# Altium integrated library Altium_WCAP-ATLI_rev19a.IntLib: 162 symbols (part 1 of 2) (continued)
## 860080374010
designator C?, comment 270uF, 16V
WCAP-ATLI THT Aluminum Electrolytic Capacitors, D8mm x L11.5mm, 270uF, +/-20%, 16VDC; Part Number: 860080374010; Dissipation Factor: 12%; Endurance: 3000h; Leakage Current: 43.2uA; Ripple Current max.: 600mA; Technical Reference: ATEE115271M016DSPA7C000; ComponentLink1Description: Manufacturer; ComponentLink1URL: http://www.we-online.de; ComponentLink2Description: Datasheet; ComponentLink2URL: https://katalog.we-online.com/pbs/datasheet/860080374010.pdf; Length: 11.5mm; Mounting Technology: THT; Operating Temperature: -55 to +105degC; Packaging: Ammo Pack; Published Date: August 2019; Capacitance: 270uF; Diameter: 8mm; Publisher: Wurth Elektronik; Capacitance Tolerance: +/-20%; Rated Voltage: 16VDC
footprint WCAP-ATLI_8x11.5
pins: 1 N, 2 P

## 860080374011
designator C?, comment 330uF, 16V
WCAP-ATLI THT Aluminum Electrolytic Capacitors, D8mm x L11.5mm, 330uF, +/-20%, 16VDC; Part Number: 860080374011; Dissipation Factor: 12%; Endurance: 3000h; Leakage Current: 52.8uA; Ripple Current max.: 740mA; Technical Reference: ATEE115331M016DSPA7C000; ComponentLink1Description: Manufacturer; ComponentLink1URL: http://www.we-online.de; ComponentLink2Description: Datasheet; ComponentLink2URL: https://katalog.we-online.com/pbs/datasheet/860080374011.pdf; Length: 11.5mm; Mounting Technology: THT; Operating Temperature: -55 to +105degC; Packaging: Ammo Pack; Published Date: August 2019; Capacitance: 330uF; Diameter: 8mm; Publisher: Wurth Elektronik; Capacitance Tolerance: +/-20%; Rated Voltage: 16VDC
footprint WCAP-ATLI_8x11.5
pins: 1 N, 2 P

## 860080374012
designator C?, comment 390uF, 16V
WCAP-ATLI THT Aluminum Electrolytic Capacitors, D8mm x L16mm, 390uF, +/-20%, 16VDC; Part Number: 860080374012; Dissipation Factor: 12%; Endurance: 3000h; Leakage Current: 62.4uA; Ripple Current max.: 790mA; Technical Reference: ATEE160391M016DSPA7C000; ComponentLink1Description: Manufacturer; ComponentLink1URL: http://www.we-online.de; ComponentLink2Description: Datasheet; ComponentLink2URL: https://katalog.we-online.com/pbs/datasheet/860080374012.pdf; Length: 16mm; Mounting Technology: THT; Operating Temperature: -55 to +105degC; Packaging: Ammo Pack; Published Date: August 2019; Capacitance: 390uF; Diameter: 8mm; Publisher: Wurth Elektronik; Capacitance Tolerance: +/-20%; Rated Voltage: 16VDC
footprint WCAP-ATLI_8x16
pins: 1 N, 2 P

## 860080374013
designator C?, comment 470uF, 16V
WCAP-ATLI THT Aluminum Electrolytic Capacitors, D8mm x L16mm, 470uF, +/-20%, 16VDC; Part Number: 860080374013; Dissipation Factor: 12%; Endurance: 3000h; Leakage Current: 75.2uA; Ripple Current max.: 990mA; Technical Reference: ATEE160471M016DSPA7C000; ComponentLink1Description: Manufacturer; ComponentLink1URL: http://www.we-online.de; ComponentLink2Description: Datasheet; ComponentLink2URL: https://katalog.we-online.com/pbs/datasheet/860080374013.pdf; Length: 16mm; Mounting Technology: THT; Operating Temperature: -55 to +105degC; Packaging: Ammo Pack; Published Date: August 2019; Capacitance: 470uF; Diameter: 8mm; Publisher: Wurth Elektronik; Capacitance Tolerance: +/-20%; Rated Voltage: 16VDC
footprint WCAP-ATLI_8x16
pins: 1 N, 2 P

## 860080374015
designator C?, comment 560uF, 16V
WCAP-ATLI THT Aluminum Electrolytic Capacitors, D8mm x L20mm, 560uF, +/-20%, 16VDC; Part Number: 860080374015; Dissipation Factor: 12%; Endurance: 3000h; Leakage Current: 89.6uA; Ripple Current max.: 1070mA; Technical Reference: ATEE200561M016DSPA7C000; ComponentLink1Description: Manufacturer; ComponentLink1URL: http://www.we-online.de; ComponentLink2Description: Datasheet; ComponentLink2URL: https://katalog.we-online.com/pbs/datasheet/860080374015.pdf; Length: 20mm; Mounting Technology: THT; Operating Temperature: -55 to +105degC; Packaging: Ammo Pack; Published Date: August 2019; Capacitance: 560uF; Diameter: 8mm; Publisher: Wurth Elektronik; Capacitance Tolerance: +/-20%; Rated Voltage: 16VDC
footprint WCAP-ATLI_8x20
pins: 1 N, 2 P

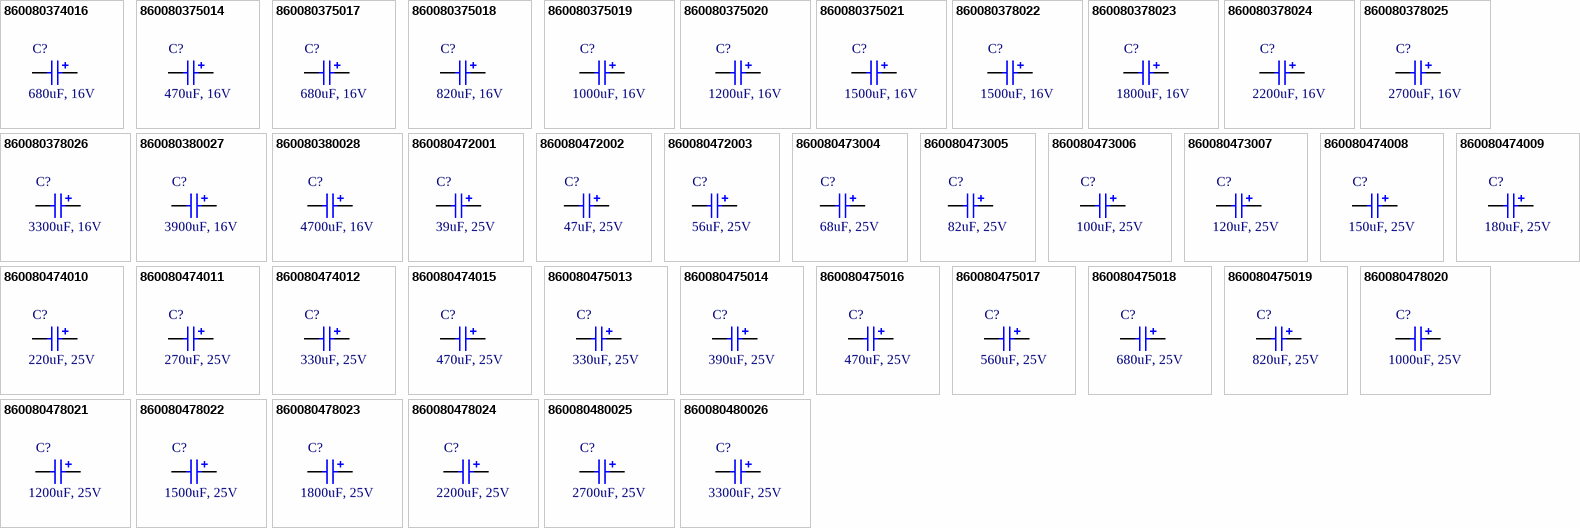
[diagram p1: symbols 860080374016 to 860080480026]

## 860080374016
designator C?, comment 680uF, 16V
WCAP-ATLI THT Aluminum Electrolytic Capacitors, D8mm x L20mm, 680uF, +/-20%, 16VDC; Part Number: 860080374016; Dissipation Factor: 12%; Endurance: 3000h; Leakage Current: 108.8uA; Ripple Current max.: 1120mA; Technical Reference: ATEE200681M016DSPA7C000; ComponentLink1Description: Manufacturer; ComponentLink1URL: http://www.we-online.de; ComponentLink2Description: Datasheet; ComponentLink2URL: https://katalog.we-online.com/pbs/datasheet/860080374016.pdf; Length: 20mm; Mounting Technology: THT; Operating Temperature: -55 to +105degC; Packaging: Ammo Pack; Published Date: August 2019; Capacitance: 680uF; Diameter: 8mm; Publisher: Wurth Elektronik; Capacitance Tolerance: +/-20%; Rated Voltage: 16VDC
footprint WCAP-ATLI_8x20
pins: 1 N, 2 P

## 860080375014
designator C?, comment 470uF, 16V
WCAP-ATLI THT Aluminum Electrolytic Capacitors, D10mm x L12.5mm, 470uF, +/-20%, 16VDC; Part Number: 860080375014; Dissipation Factor: 12%; Endurance: 5000h; Leakage Current: 75.2uA; Ripple Current max.: 1000mA; Technical Reference: ATEF125471M016DSPA9E000; ComponentLink1Description: Manufacturer; ComponentLink1URL: http://www.we-online.de; ComponentLink2Description: Datasheet; ComponentLink2URL: https://katalog.we-online.com/pbs/datasheet/860080375014.pdf; Length: 12.5mm; Mounting Technology: THT; Operating Temperature: -55 to +105degC; Packaging: Ammo Pack; Published Date: August 2019; Capacitance: 470uF; Diameter: 10mm; Publisher: Wurth Elektronik; Capacitance Tolerance: +/-20%; Rated Voltage: 16VDC
footprint WCAP-ATLI_10x12.5
pins: 1 N, 2 P

## 860080375017
designator C?, comment 680uF, 16V
WCAP-ATLI THT Aluminum Electrolytic Capacitors, D10mm x L16mm, 680uF, +/-20%, 16VDC; Part Number: 860080375017; Dissipation Factor: 12%; Endurance: 5000h; Leakage Current: 108.8uA; Ripple Current max.: 1280mA; Technical Reference: ATEF160681M016DSPAAE000; ComponentLink1Description: Manufacturer; ComponentLink1URL: http://www.we-online.de; ComponentLink2Description: Datasheet; ComponentLink2URL: https://katalog.we-online.com/pbs/datasheet/860080375017.pdf; Length: 16mm; Mounting Technology: THT; Operating Temperature: -55 to +105degC; Packaging: Ammo Pack; Published Date: August 2019; Capacitance: 680uF; Diameter: 10mm; Publisher: Wurth Elektronik; Capacitance Tolerance: +/-20%; Rated Voltage: 16VDC
footprint WCAP-ATLI_10x16
pins: 1 N, 2 P

## 860080375018
designator C?, comment 820uF, 16V
WCAP-ATLI THT Aluminum Electrolytic Capacitors, D10mm x L20mm, 820uF, +/-20%, 16VDC; Part Number: 860080375018; Dissipation Factor: 12%; Endurance: 5000h; Leakage Current: 131.2uA; Ripple Current max.: 1400mA; Technical Reference: ATEF200821M016DSPAAE000; ComponentLink1Description: Manufacturer; ComponentLink1URL: http://www.we-online.de; ComponentLink2Description: Datasheet; ComponentLink2URL: https://katalog.we-online.com/pbs/datasheet/860080375018.pdf; Length: 20mm; Mounting Technology: THT; Operating Temperature: -55 to +105degC; Packaging: Ammo Pack; Published Date: August 2019; Capacitance: 820uF; Diameter: 10mm; Publisher: Wurth Elektronik; Capacitance Tolerance: +/-20%; Rated Voltage: 16VDC
footprint WCAP-ATLI_10x20
pins: 1 N, 2 P

## 860080375019
designator C?, comment 1000uF, 16V
WCAP-ATLI THT Aluminum Electrolytic Capacitors, D10mm x L20mm, 1000uF, +/-20%, 16VDC; Part Number: 860080375019; Dissipation Factor: 12%; Endurance: 5000h; Leakage Current: 160uA; Ripple Current max.: 1840mA; Technical Reference: ATEF200102M016DSPAAE000; ComponentLink1Description: Manufacturer; ComponentLink1URL: http://www.we-online.de; ComponentLink2Description: Datasheet; ComponentLink2URL: https://katalog.we-online.com/pbs/datasheet/860080375019.pdf; Length: 20mm; Mounting Technology: THT; Operating Temperature: -55 to +105degC; Packaging: Ammo Pack; Published Date: August 2019; Capacitance: 1000uF; Diameter: 10mm; Publisher: Wurth Elektronik; Capacitance Tolerance: +/-20%; Rated Voltage: 16VDC
footprint WCAP-ATLI_10x20
pins: 1 N, 2 P

## 860080375020
designator C?, comment 1200uF, 16V
WCAP-ATLI THT Aluminum Electrolytic Capacitors, D10mm x L25mm, 1200uF, +/-20%, 16VDC; Part Number: 860080375020; Dissipation Factor: 12%; Endurance: 5000h; Leakage Current: 192uA; Ripple Current max.: 1920mA; Technical Reference: ATEF250122M016DSPAAE000; ComponentLink1Description: Manufacturer; ComponentLink1URL: http://www.we-online.de; ComponentLink2Description: Datasheet; ComponentLink2URL: https://katalog.we-online.com/pbs/datasheet/860080375020.pdf; Length: 25mm; Mounting Technology: THT; Operating Temperature: -55 to +105degC; Packaging: Ammo Pack; Published Date: August 2019; Capacitance: 1200uF; Diameter: 10mm; Publisher: Wurth Elektronik; Capacitance Tolerance: +/-20%; Rated Voltage: 16VDC
footprint WCAP-ATLI_10x25
pins: 1 N, 2 P

## 860080375021
designator C?, comment 1500uF, 16V
WCAP-ATLI THT Aluminum Electrolytic Capacitors, D10mm x L25mm, 1500uF, +/-20%, 16VDC; Part Number: 860080375021; Dissipation Factor: 12%; Endurance: 5000h; Leakage Current: 240uA; Ripple Current max.: 2050mA; Technical Reference: ATEF250152M016DSPAAE000; ComponentLink1Description: Manufacturer; ComponentLink1URL: http://www.we-online.de; ComponentLink2Description: Datasheet; ComponentLink2URL: https://katalog.we-online.com/pbs/datasheet/860080375021.pdf; Length: 25mm; Mounting Technology: THT; Operating Temperature: -55 to +105degC; Packaging: Ammo Pack; Published Date: August 2019; Capacitance: 1500uF; Diameter: 10mm; Publisher: Wurth Elektronik; Capacitance Tolerance: +/-20%; Rated Voltage: 16VDC
footprint WCAP-ATLI_10x25
pins: 1 N, 2 P

## 860080378022
designator C?, comment 1500uF, 16V
WCAP-ATLI THT Aluminum Electrolytic Capacitors, D13mm x L20mm, 1500uF, +/-20%, 16VDC; Part Number: 860080378022; Dissipation Factor: 12%; Endurance: 5000h; Leakage Current: 240uA; Ripple Current max.: 2200mA; Technical Reference: ATEI200152M016DSPACE000; ComponentLink1Description: Manufacturer; ComponentLink1URL: http://www.we-online.de; ComponentLink2Description: Datasheet; ComponentLink2URL: https://katalog.we-online.com/pbs/datasheet/860080378022.pdf; Length: 20mm; Mounting Technology: THT; Operating Temperature: -55 to +105degC; Packaging: Ammo Pack; Published Date: August 2019; Capacitance: 1500uF; Diameter: 13mm; Publisher: Wurth Elektronik; Capacitance Tolerance: +/-20%; Rated Voltage: 16VDC
footprint WCAP-ATLI_13x20
pins: 1 N, 2 P

## 860080378023
designator C?, comment 1800uF, 16V
WCAP-ATLI THT Aluminum Electrolytic Capacitors, D13mm x L20mm, 1800uF, +/-20%, 16VDC; Part Number: 860080378023; Dissipation Factor: 12%; Endurance: 5000h; Leakage Current: 288uA; Ripple Current max.: 2380mA; Technical Reference: ATEI200182M016DSPACE000; ComponentLink1Description: Manufacturer; ComponentLink1URL: http://www.we-online.de; ComponentLink2Description: Datasheet; ComponentLink2URL: https://katalog.we-online.com/pbs/datasheet/860080378023.pdf; Length: 20mm; Mounting Technology: THT; Operating Temperature: -55 to +105degC; Packaging: Ammo Pack; Published Date: August 2019; Capacitance: 1800uF; Diameter: 13mm; Publisher: Wurth Elektronik; Capacitance Tolerance: +/-20%; Rated Voltage: 16VDC
footprint WCAP-ATLI_13x20
pins: 1 N, 2 P

## 860080378024
designator C?, comment 2200uF, 16V
WCAP-ATLI THT Aluminum Electrolytic Capacitors, D13mm x L25mm, 2200uF, +/-20%, 16VDC; Part Number: 860080378024; Dissipation Factor: 14%; Endurance: 5000h; Leakage Current: 352uA; Ripple Current max.: 2750mA; Technical Reference: ATEI250222M016DSPACE000; ComponentLink1Description: Manufacturer; ComponentLink1URL: http://www.we-online.de; ComponentLink2Description: Datasheet; ComponentLink2URL: https://katalog.we-online.com/pbs/datasheet/860080378024.pdf; Length: 25mm; Mounting Technology: THT; Operating Temperature: -55 to +105degC; Packaging: Ammo Pack; Published Date: August 2019; Capacitance: 2200uF; Diameter: 13mm; Publisher: Wurth Elektronik; Capacitance Tolerance: +/-20%; Rated Voltage: 16VDC
footprint WCAP-ATLI_13x25
pins: 1 N, 2 P

## 860080378025
designator C?, comment 2700uF, 16V
WCAP-ATLI THT Aluminum Electrolytic Capacitors, D13mm x L25mm, 2700uF, +/-20%, 16VDC; Part Number: 860080378025; Dissipation Factor: 14%; Endurance: 5000h; Leakage Current: 432uA; Ripple Current max.: 3000mA; Technical Reference: ATEI250272M016DSPACE000; ComponentLink1Description: Manufacturer; ComponentLink1URL: http://www.we-online.de; ComponentLink2Description: Datasheet; ComponentLink2URL: https://katalog.we-online.com/pbs/datasheet/860080378025.pdf; Length: 25mm; Mounting Technology: THT; Operating Temperature: -55 to +105degC; Packaging: Ammo Pack; Published Date: August 2019; Capacitance: 2700uF; Diameter: 13mm; Publisher: Wurth Elektronik; Capacitance Tolerance: +/-20%; Rated Voltage: 16VDC
footprint WCAP-ATLI_13x25
pins: 1 N, 2 P

## 860080378026
designator C?, comment 3300uF, 16V
WCAP-ATLI THT Aluminum Electrolytic Capacitors, D13mm x L35mm, 3300uF, +/-20%, 16VDC; Part Number: 860080378026; Dissipation Factor: 16%; Endurance: 5000h; Leakage Current: 528uA; Ripple Current max.: 3490mA; Technical Reference: ATEI350332M016DSPABE000; ComponentLink1Description: Manufacturer; ComponentLink1URL: http://www.we-online.de; ComponentLink2Description: Datasheet; ComponentLink2URL: https://katalog.we-online.com/pbs/datasheet/860080378026.pdf; Length: 35mm; Mounting Technology: THT; Operating Temperature: -55 to +105degC; Packaging: Ammo Pack; Published Date: August 2019; Capacitance: 3300uF; Diameter: 13mm; Publisher: Wurth Elektronik; Capacitance Tolerance: +/-20%; Rated Voltage: 16VDC
footprint WCAP-ATLI_13x35
pins: 1 N, 2 P

## 860080380027
designator C?, comment 3900uF, 16V
WCAP-ATLI THT Aluminum Electrolytic Capacitors, D16mm x L25mm, 3900uF, +/-20%, 16VDC; Part Number: 860080380027; Dissipation Factor: 16%; Endurance: 5000h; Leakage Current: 624uA; Ripple Current max.: 3520mA; Technical Reference: ATEK250392M016DSPAEE000; ComponentLink1Description: Manufacturer; ComponentLink1URL: http://www.we-online.de; ComponentLink2Description: Datasheet; ComponentLink2URL: https://katalog.we-online.com/pbs/datasheet/860080380027.pdf; Length: 25mm; Mounting Technology: THT; Operating Temperature: -55 to +105degC; Packaging: Ammo Pack; Published Date: August 2019; Capacitance: 3900uF; Diameter: 16mm; Publisher: Wurth Elektronik; Capacitance Tolerance: +/-20%; Rated Voltage: 16VDC
footprint WCAP-ATLI_16x25
pins: 1 N, 2 P

## 860080380028
designator C?, comment 4700uF, 16V
WCAP-ATLI THT Aluminum Electrolytic Capacitors, D16mm x L31.5mm, 4700uF, +/-20%, 16VDC; Part Number: 860080380028; Dissipation Factor: 18%; Endurance: 5000h; Leakage Current: 752uA; Ripple Current max.: 3770mA; Technical Reference: ATEK315472M016DSPADE000; ComponentLink1Description: Manufacturer; ComponentLink1URL: http://www.we-online.de; ComponentLink2Description: Datasheet; ComponentLink2URL: https://katalog.we-online.com/pbs/datasheet/860080380028.pdf; Length: 31.5mm; Mounting Technology: THT; Operating Temperature: -55 to +105degC; Packaging: Ammo Pack; Published Date: August 2019; Capacitance: 4700uF; Diameter: 16mm; Publisher: Wurth Elektronik; Capacitance Tolerance: +/-20%; Rated Voltage: 16VDC
footprint WCAP-ATLI_16x31.5
pins: 1 N, 2 P

## 860080472001
designator C?, comment 39uF, 25V
WCAP-ATLI THT Aluminum Electrolytic Capacitors, D5mm x L11mm, 39uF, +/-20%, 25VDC; Part Number: 860080472001; Dissipation Factor: 10%; Endurance: 2000h; Leakage Current: 9.75uA; Ripple Current max.: 210mA; Technical Reference: ATEC110390M025DSPA3B000; ComponentLink1Description: Manufacturer; ComponentLink1URL: http://www.we-online.de; ComponentLink2Description: Datasheet; ComponentLink2URL: https://katalog.we-online.com/pbs/datasheet/860080472001.pdf; Length: 11mm; Mounting Technology: THT; Operating Temperature: -55 to +105degC; Packaging: Ammo Pack; Published Date: August 2019; Capacitance: 39uF; Diameter: 5mm; Publisher: Wurth Elektronik; Capacitance Tolerance: +/-20%; Rated Voltage: 25VDC
footprint WCAP-ATLI_5x11
pins: 1 N, 2 P

## 860080472002
designator C?, comment 47uF, 25V
WCAP-ATLI THT Aluminum Electrolytic Capacitors, D5mm x L11mm, 47uF, +/-20%, 25VDC; Part Number: 860080472002; Dissipation Factor: 10%; Endurance: 2000h; Leakage Current: 11.75uA; Ripple Current max.: 240mA; Technical Reference: ATEC110470M025DSPA3B000; ComponentLink1Description: Manufacturer; ComponentLink1URL: http://www.we-online.de; ComponentLink2Description: Datasheet; ComponentLink2URL: https://katalog.we-online.com/pbs/datasheet/860080472002.pdf; Length: 11mm; Mounting Technology: THT; Operating Temperature: -55 to +105degC; Packaging: Ammo Pack; Published Date: August 2019; Capacitance: 47uF; Diameter: 5mm; Publisher: Wurth Elektronik; Capacitance Tolerance: +/-20%; Rated Voltage: 25VDC
footprint WCAP-ATLI_5x11
pins: 1 N, 2 P

## 860080472003
designator C?, comment 56uF, 25V
WCAP-ATLI THT Aluminum Electrolytic Capacitors, D5mm x L11mm, 56uF, +/-20%, 25VDC; Part Number: 860080472003; Dissipation Factor: 10%; Endurance: 2000h; Leakage Current: 14uA; Ripple Current max.: 256mA; Technical Reference: ATEC110560M025DSPA3B000; ComponentLink1Description: Manufacturer; ComponentLink1URL: http://www.we-online.de; ComponentLink2Description: Datasheet; ComponentLink2URL: https://katalog.we-online.com/pbs/datasheet/860080472003.pdf; Length: 11mm; Mounting Technology: THT; Operating Temperature: -55 to +105degC; Packaging: Ammo Pack; Published Date: August 2019; Capacitance: 56uF; Diameter: 5mm; Publisher: Wurth Elektronik; Capacitance Tolerance: +/-20%; Rated Voltage: 25VDC
footprint WCAP-ATLI_5x11
pins: 1 N, 2 P

## 860080473004
designator C?, comment 68uF, 25V
WCAP-ATLI THT Aluminum Electrolytic Capacitors, D6.3mm x L11mm, 68uF, +/-20%, 25VDC; Part Number: 860080473004; Dissipation Factor: 10%; Endurance: 2000h; Leakage Current: 17uA; Ripple Current max.: 300mA; Technical Reference: ATED110680M025DSPA4B000; ComponentLink1Description: Manufacturer; ComponentLink1URL: http://www.we-online.de; ComponentLink2Description: Datasheet; ComponentLink2URL: https://katalog.we-online.com/pbs/datasheet/860080473004.pdf; Length: 11mm; Mounting Technology: THT; Operating Temperature: -55 to +105degC; Packaging: Ammo Pack; Published Date: August 2019; Capacitance: 68uF; Diameter: 6.3mm; Publisher: Wurth Elektronik; Capacitance Tolerance: +/-20%; Rated Voltage: 25VDC
footprint WCAP-ATLI_6.3x11
pins: 1 N, 2 P

## 860080473005
designator C?, comment 82uF, 25V
WCAP-ATLI THT Aluminum Electrolytic Capacitors, D6.3mm x L11mm, 82uF, +/-20%, 25VDC; Part Number: 860080473005; Dissipation Factor: 10%; Endurance: 2000h; Leakage Current: 20.5uA; Ripple Current max.: 350mA; Technical Reference: ATED110820M025DSPA4B000; ComponentLink1Description: Manufacturer; ComponentLink1URL: http://www.we-online.de; ComponentLink2Description: Datasheet; ComponentLink2URL: https://katalog.we-online.com/pbs/datasheet/860080473005.pdf; Length: 11mm; Mounting Technology: THT; Operating Temperature: -55 to +105degC; Packaging: Ammo Pack; Published Date: August 2019; Capacitance: 82uF; Diameter: 6.3mm; Publisher: Wurth Elektronik; Capacitance Tolerance: +/-20%; Rated Voltage: 25VDC
footprint WCAP-ATLI_6.3x11
pins: 1 N, 2 P

## 860080473006
designator C?, comment 100uF, 25V
WCAP-ATLI THT Aluminum Electrolytic Capacitors, D6.3mm x L11mm, 100uF, +/-20%, 25VDC; Part Number: 860080473006; Dissipation Factor: 10%; Endurance: 2000h; Leakage Current: 25uA; Ripple Current max.: 410mA; Technical Reference: ATED110101M025DSPA4B000; ComponentLink1Description: Manufacturer; ComponentLink1URL: http://www.we-online.de; ComponentLink2Description: Datasheet; ComponentLink2URL: https://katalog.we-online.com/pbs/datasheet/860080473006.pdf; Length: 11mm; Mounting Technology: THT; Operating Temperature: -55 to +105degC; Packaging: Ammo Pack; Published Date: August 2019; Capacitance: 100uF; Diameter: 6.3mm; Publisher: Wurth Elektronik; Capacitance Tolerance: +/-20%; Rated Voltage: 25VDC
footprint WCAP-ATLI_6.3x11
pins: 1 N, 2 P

## 860080473007
designator C?, comment 120uF, 25V
WCAP-ATLI THT Aluminum Electrolytic Capacitors, D6.3mm x L15mm, 120uF, +/-20%, 25VDC; Part Number: 860080473007; Dissipation Factor: 10%; Endurance: 2000h; Leakage Current: 30uA; Ripple Current max.: 490mA; Technical Reference: ATED150121M025DSPA4B000; ComponentLink1Description: Manufacturer; ComponentLink1URL: http://www.we-online.de; ComponentLink2Description: Datasheet; ComponentLink2URL: https://katalog.we-online.com/pbs/datasheet/860080473007.pdf; Length: 15mm; Mounting Technology: THT; Operating Temperature: -55 to +105degC; Packaging: Ammo Pack; Published Date: August 2019; Capacitance: 120uF; Diameter: 6.3mm; Publisher: Wurth Elektronik; Capacitance Tolerance: +/-20%; Rated Voltage: 25VDC
footprint WCAP-ATLI_6.3x15
pins: 1 N, 2 P

## 860080474008
designator C?, comment 150uF, 25V
WCAP-ATLI THT Aluminum Electrolytic Capacitors, D8mm x L11.5mm, 150uF, +/-20%, 25VDC; Part Number: 860080474008; Dissipation Factor: 10%; Endurance: 3000h; Leakage Current: 37.5uA; Ripple Current max.: 540mA; Technical Reference: ATEE115151M025DSPA7C000; ComponentLink1Description: Manufacturer; ComponentLink1URL: http://www.we-online.de; ComponentLink2Description: Datasheet; ComponentLink2URL: https://katalog.we-online.com/pbs/datasheet/860080474008.pdf; Length: 11.5mm; Mounting Technology: THT; Operating Temperature: -55 to +105degC; Packaging: Ammo Pack; Published Date: August 2019; Capacitance: 150uF; Diameter: 8mm; Publisher: Wurth Elektronik; Capacitance Tolerance: +/-20%; Rated Voltage: 25VDC
footprint WCAP-ATLI_8x11.5
pins: 1 N, 2 P

## 860080474009
designator C?, comment 180uF, 25V
WCAP-ATLI THT Aluminum Electrolytic Capacitors, D8mm x L11.5mm, 180uF, +/-20%, 25VDC; Part Number: 860080474009; Dissipation Factor: 10%; Endurance: 3000h; Leakage Current: 45uA; Ripple Current max.: 620mA; Technical Reference: ATEE115181M025DSPA7C000; ComponentLink1Description: Manufacturer; ComponentLink1URL: http://www.we-online.de; ComponentLink2Description: Datasheet; ComponentLink2URL: https://katalog.we-online.com/pbs/datasheet/860080474009.pdf; Length: 11.5mm; Mounting Technology: THT; Operating Temperature: -55 to +105degC; Packaging: Ammo Pack; Published Date: August 2019; Capacitance: 180uF; Diameter: 8mm; Publisher: Wurth Elektronik; Capacitance Tolerance: +/-20%; Rated Voltage: 25VDC
footprint WCAP-ATLI_8x11.5
pins: 1 N, 2 P

## 860080474010
designator C?, comment 220uF, 25V
WCAP-ATLI THT Aluminum Electrolytic Capacitors, D8mm x L11.5mm, 220uF, +/-20%, 25VDC; Part Number: 860080474010; Dissipation Factor: 10%; Endurance: 3000h; Leakage Current: 55uA; Ripple Current max.: 750mA; Technical Reference: ATEE115221M025DSPA7C000; ComponentLink1Description: Manufacturer; ComponentLink1URL: http://www.we-online.de; ComponentLink2Description: Datasheet; ComponentLink2URL: https://katalog.we-online.com/pbs/datasheet/860080474010.pdf; Length: 11.5mm; Mounting Technology: THT; Operating Temperature: -55 to +105degC; Packaging: Ammo Pack; Published Date: August 2019; Capacitance: 220uF; Diameter: 8mm; Publisher: Wurth Elektronik; Capacitance Tolerance: +/-20%; Rated Voltage: 25VDC
footprint WCAP-ATLI_8x11.5
pins: 1 N, 2 P

## 860080474011
designator C?, comment 270uF, 25V
WCAP-ATLI THT Aluminum Electrolytic Capacitors, D8mm x L16mm, 270uF, +/-20%, 25VDC; Part Number: 860080474011; Dissipation Factor: 10%; Endurance: 3000h; Leakage Current: 67.5uA; Ripple Current max.: 850mA; Technical Reference: ATEE160271M025DSPA7C000; ComponentLink1Description: Manufacturer; ComponentLink1URL: http://www.we-online.de; ComponentLink2Description: Datasheet; ComponentLink2URL: https://katalog.we-online.com/pbs/datasheet/860080474011.pdf; Length: 16mm; Mounting Technology: THT; Operating Temperature: -55 to +105degC; Packaging: Ammo Pack; Published Date: August 2019; Capacitance: 270uF; Diameter: 8mm; Publisher: Wurth Elektronik; Capacitance Tolerance: +/-20%; Rated Voltage: 25VDC
footprint WCAP-ATLI_8x16
pins: 1 N, 2 P

## 860080474012
designator C?, comment 330uF, 25V
WCAP-ATLI THT Aluminum Electrolytic Capacitors, D8mm x L16mm, 330uF, +/-20%, 25VDC; Part Number: 860080474012; Dissipation Factor: 10%; Endurance: 3000h; Leakage Current: 82.5uA; Ripple Current max.: 990mA; Technical Reference: ATEE160331M025DSPA7C000; ComponentLink1Description: Manufacturer; ComponentLink1URL: http://www.we-online.de; ComponentLink2Description: Datasheet; ComponentLink2URL: https://katalog.we-online.com/pbs/datasheet/860080474012.pdf; Length: 16mm; Mounting Technology: THT; Operating Temperature: -55 to +105degC; Packaging: Ammo Pack; Published Date: August 2019; Capacitance: 330uF; Diameter: 8mm; Publisher: Wurth Elektronik; Capacitance Tolerance: +/-20%; Rated Voltage: 25VDC
footprint WCAP-ATLI_8x16
pins: 1 N, 2 P

## 860080474015
designator C?, comment 470uF, 25V
WCAP-ATLI THT Aluminum Electrolytic Capacitors, D8mm x L20mm, 470uF, +/-20%, 25VDC; Part Number: 860080474015; Dissipation Factor: 10%; Endurance: 3000h; Leakage Current: 117.5uA; Ripple Current max.: 1260mA; Technical Reference: ATEE200471M025DSPA7C000; ComponentLink1Description: Manufacturer; ComponentLink1URL: http://www.we-online.de; ComponentLink2Description: Datasheet; ComponentLink2URL: https://katalog.we-online.com/pbs/datasheet/860080474015.pdf; Length: 20mm; Mounting Technology: THT; Operating Temperature: -55 to +105degC; Packaging: Ammo Pack; Published Date: August 2019; Capacitance: 470uF; Diameter: 8mm; Publisher: Wurth Elektronik; Capacitance Tolerance: +/-20%; Rated Voltage: 25VDC
footprint WCAP-ATLI_8x20
pins: 1 N, 2 P

## 860080475013
designator C?, comment 330uF, 25V
WCAP-ATLI THT Aluminum Electrolytic Capacitors, D10mm x L12.5mm, 330uF, +/-20%, 25VDC; Part Number: 860080475013; Dissipation Factor: 10%; Endurance: 5000h; Leakage Current: 82.5uA; Ripple Current max.: 1010mA; Technical Reference: ATEF125331M025DSPA9E000; ComponentLink1Description: Manufacturer; ComponentLink1URL: http://www.we-online.de; ComponentLink2Description: Datasheet; ComponentLink2URL: https://katalog.we-online.com/pbs/datasheet/860080475013.pdf; Length: 12.5mm; Mounting Technology: THT; Operating Temperature: -55 to +105degC; Packaging: Ammo Pack; Published Date: August 2019; Capacitance: 330uF; Diameter: 10mm; Publisher: Wurth Elektronik; Capacitance Tolerance: +/-20%; Rated Voltage: 25VDC
footprint WCAP-ATLI_10x12.5
pins: 1 N, 2 P

## 860080475014
designator C?, comment 390uF, 25V
WCAP-ATLI THT Aluminum Electrolytic Capacitors, D10mm x L12.5mm, 390uF, +/-20%, 25VDC; Part Number: 860080475014; Dissipation Factor: 10%; Endurance: 5000h; Leakage Current: 97.5uA; Ripple Current max.: 1050mA; Technical Reference: ATEF125391M025DSPA9E000; ComponentLink1Description: Manufacturer; ComponentLink1URL: http://www.we-online.de; ComponentLink2Description: Datasheet; ComponentLink2URL: https://katalog.we-online.com/pbs/datasheet/860080475014.pdf; Length: 12.5mm; Mounting Technology: THT; Operating Temperature: -55 to +105degC; Packaging: Ammo Pack; Published Date: August 2019; Capacitance: 390uF; Diameter: 10mm; Publisher: Wurth Elektronik; Capacitance Tolerance: +/-20%; Rated Voltage: 25VDC
footprint WCAP-ATLI_10x12.5
pins: 1 N, 2 P

## 860080475016
designator C?, comment 470uF, 25V
WCAP-ATLI THT Aluminum Electrolytic Capacitors, D10mm x L16mm, 470uF, +/-20%, 25VDC; Part Number: 860080475016; Dissipation Factor: 10%; Endurance: 5000h; Leakage Current: 117.5uA; Ripple Current max.: 1415mA; Technical Reference: ATEF160471M025DSPAAE000; ComponentLink1Description: Manufacturer; ComponentLink1URL: http://www.we-online.de; ComponentLink2Description: Datasheet; ComponentLink2URL: https://katalog.we-online.com/pbs/datasheet/860080475016.pdf; Length: 16mm; Mounting Technology: THT; Operating Temperature: -55 to +105degC; Packaging: Ammo Pack; Published Date: August 2019; Capacitance: 470uF; Diameter: 10mm; Publisher: Wurth Elektronik; Capacitance Tolerance: +/-20%; Rated Voltage: 25VDC
footprint WCAP-ATLI_10x16
pins: 1 N, 2 P

## 860080475017
designator C?, comment 560uF, 25V
WCAP-ATLI THT Aluminum Electrolytic Capacitors, D10mm x L20mm, 560uF, +/-20%, 25VDC; Part Number: 860080475017; Dissipation Factor: 10%; Endurance: 5000h; Leakage Current: 140uA; Ripple Current max.: 1450mA; Technical Reference: ATEF200561M025DSPAAE000; ComponentLink1Description: Manufacturer; ComponentLink1URL: http://www.we-online.de; ComponentLink2Description: Datasheet; ComponentLink2URL: https://katalog.we-online.com/pbs/datasheet/860080475017.pdf; Length: 20mm; Mounting Technology: THT; Operating Temperature: -55 to +105degC; Packaging: Ammo Pack; Published Date: August 2019; Capacitance: 560uF; Diameter: 10mm; Publisher: Wurth Elektronik; Capacitance Tolerance: +/-20%; Rated Voltage: 25VDC
footprint WCAP-ATLI_10x20
pins: 1 N, 2 P
